# Altium footprint library Dart_Controller_Pcblib.PcbLib: 132 footprints (part 9 of 9)
Each footprint in its own frame and in the unit in brackets; x right, y up, seen from the top. Pads: shape width x height; smd on the part's side, far side on the other; paste and mask are expansions set on the pad; w line width, h text height; cw(c..) or ccw(c..) is an arc to the next point about the centre after c.
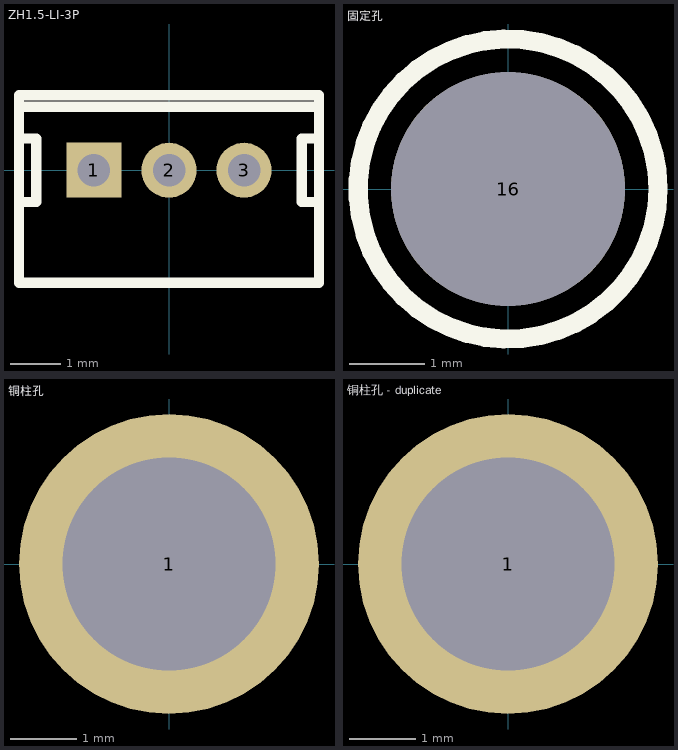
[diagram p8: the footprints below, top view; thin cyan lines are the x and y axes]

## ZH1.5-LI-3P [mm] "长：6.0，宽：3.65，高：4.55  淘宝ID:黄晶宝石   店铺网址:https://shop463601444.taobao.com"
pads (3):
  rect 1.1x1.1 hole 0.65: 1(-1.5,0)
  round 1.1 hole 0.65: 2(0,0) 3(1.5,0)
Top Overlay:
  lines w0.203: -3,-0.635 -2.655,-0.635 -2.655,0.635 -3,0.635 ; -3,1.27 3,1.27 ; 3,-0.635 2.655,-0.635 2.655,0.635 3,0.635 ; -3,-2.25 3,-2.25 3,1.5 -3,1.5 -3,-2.25
Mechanical 15:
  circle w0.05: c0,0 r0.35
  lines w0.05: -0.5,0 0.5,0 ; 0,-0.5 0,0.5
3D body "ZH1.5-LI-3P.STEP": height 4.6, standoff -2.55, extent -3,-2.15 3,1.5

## 固定孔 [mm]
pads (1):
  round 3.1 hole 3.1 mask+0: 16(0,0)
Top Overlay:
  circle w0.254: c0,0 r1.988

## 铜柱孔 [mm]
pads (1):
  round 4.5 hole 3.2 mask+0: 1(0,0)

## 铜柱孔 - duplicate [mm]
pads (1):
  round 4.5 hole 3.2 mask+0: 1(0,0)